# Altium footprint library DA, DD IC.PcbLib: 64 footprints (part 2 of 4)
Each footprint in its own frame and in the unit in brackets; x right, y up, seen from the top. Pads: shape width x height; smd on the part's side, far side on the other; paste and mask are expansions set on the pad; w line width, h text height; cw(c..) or ccw(c..) is an arc to the next point about the centre after c.
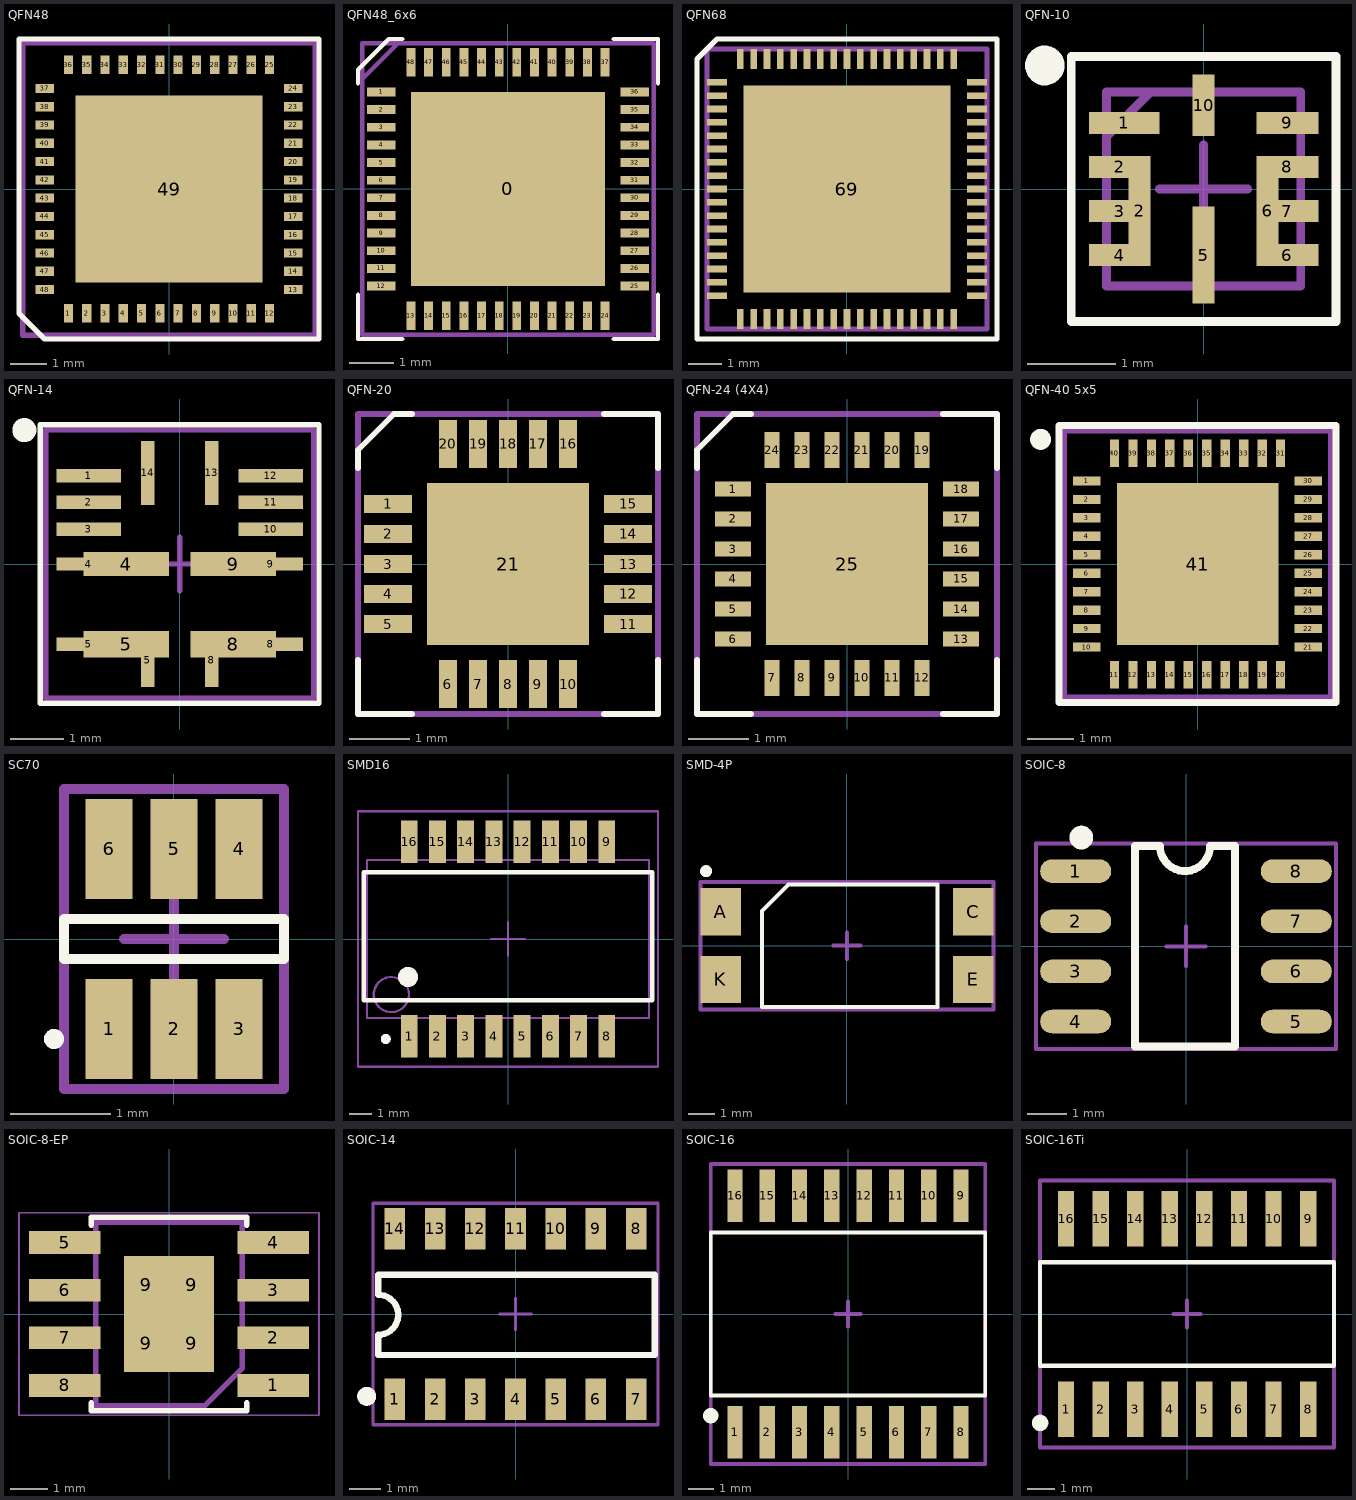
[diagram p1: the footprints below, top view; thin cyan lines are the x and y axes]

## QFN48 [mm] "6x6mm"
height 0.9
pads (49):
  rect 0.25x0.5 smd mask+0.07: 1(-2.75,-3.4) 2(-2.25,-3.4) 3(-1.75,-3.4) 4(-1.25,-3.4) 5(-0.75,-3.4) 6(-0.25,-3.4) 7(0.25,-3.4) 8(0.75,-3.4) 9(1.25,-3.4) 10(1.75,-3.4) 11(2.25,-3.4) 12(2.75,-3.4) 25(2.75,3.4) 26(2.25,3.4) 27(1.75,3.4) 28(1.25,3.4) 29(0.75,3.4) 30(0.25,3.4) 31(-0.25,3.4) 32(-0.75,3.4) 33(-1.25,3.4) 34(-1.75,3.4) 35(-2.25,3.4) 36(-2.75,3.4)
  rect 0.5x0.25 smd mask+0.07: 13(3.4,-2.75) 14(3.4,-2.25) 15(3.4,-1.75) 16(3.4,-1.25) 17(3.4,-0.75) 18(3.4,-0.25) 19(3.4,0.25) 20(3.4,0.75) 21(3.4,1.25) 22(3.4,1.75) 23(3.4,2.25) 24(3.4,2.75) 37(-3.4,2.75) 38(-3.4,2.25) 39(-3.4,1.75) 40(-3.4,1.25) 41(-3.4,0.75) 42(-3.4,0.25) 43(-3.4,-0.25) 44(-3.4,-0.75) 45(-3.4,-1.25) 46(-3.4,-1.75) 47(-3.4,-2.25) 48(-3.4,-2.75)
  rect 5.1x5.1 smd paste-2539.97 mask+0.07: 49(0,0)
Top Overlay:
  lines w0.15: -4.1,-3.4 -3.4,-4.1 4.1,-4.1 4.1,4.1 -4.1,4.1 -4.1,-3.4
Top Paste:
  rectangle: -0.5,-0.5 0.5,0.5
  rectangle: -0.5,1 0.5,2
  rectangle: -0.5,-2 0.5,-1
  rectangle: -2,-0.5 -1,0.5
  rectangle: -2,1 -1,2
  rectangle: -2,-2 -1,-1
  rectangle: 1,-0.5 2,0.5
  rectangle: 1,1 2,2
  rectangle: 1,-2 2,-1
Mechanical 15:
  lines w0.15: -0.5,0 0.5,0 ; 0,-0.5 0,0.5 ; -4,-4 -4,4 4,4 4,-4 -4,-4
3D body "ALSRobot-QFN48 7x7.step": height 0.78, standoff -0.02, extent -3.51,-3.51 3.51,3.51

## QFN48_6x6 [mm]
pads (49):
  rect 4.4x4.4 smd: 0(0,0)
  rect 0.65x0.2 smd: 1(-2.875,2.2) 2(-2.875,1.8) 3(-2.875,1.4) 4(-2.875,1) 5(-2.875,0.6) 6(-2.875,0.2) 7(-2.875,-0.2) 8(-2.875,-0.6) 9(-2.875,-1) 10(-2.875,-1.4) 11(-2.875,-1.8) 12(-2.875,-2.2) 25(2.875,-2.2) 26(2.875,-1.8) 27(2.875,-1.4) 28(2.875,-1) 29(2.875,-0.6) 30(2.875,-0.2) 31(2.875,0.2) 32(2.875,0.6) 33(2.875,1) 34(2.875,1.4) 35(2.875,1.8) 36(2.875,2.2)
  rect 0.2x0.65 smd: 13(-2.2,-2.875) 14(-1.8,-2.875) 15(-1.4,-2.875) 16(-1,-2.875) 17(-0.6,-2.875) 18(-0.2,-2.875) 19(0.2,-2.875) 20(0.6,-2.875) 21(1,-2.875) 22(1.4,-2.875) 23(1.8,-2.875) 24(2.2,-2.875) 37(2.2,2.875) 38(1.8,2.875) 39(1.4,2.875) 40(1,2.875) 41(0.6,2.875) 42(0.2,2.875) 43(-0.2,2.875) 44(-0.6,2.875) 45(-1,2.875) 46(-1.4,2.875) 47(-1.8,2.875) 48(-2.2,2.875)
Top Overlay:
  lines w0.1: -3.4,-2.4 -3.4,-3.4 -2.4,-3.4 ; -3.4,2.4 -3.4,2.7 -2.7,3.4 -2.4,3.4 ; 2.4,-3.4 3.4,-3.4 3.4,-2.4 ; 2.4,3.4 3.4,3.4 3.4,2.4
Mechanical 15:
  lines w0.1: -3.3,2.5 -2.5,3.3 ; -0.5,0 0.5,0 ; 0,-0.5 0,0.5 ; -3.3,-3.3 3.3,-3.3 3.3,3.3 -3.3,3.3 -3.3,-3.3
3D body "User Library-QFN48_0_4.step": height 0.91, standoff 0, extent -3,-3 3,3

## QFN68 [mm]
pads (69):
  rect 0.6x0.2 smd: 1(-3.9,3.2) 2(-3.9,2.8) 3(-3.9,2.4) 4(-3.9,2) 5(-3.9,1.6) 6(-3.9,1.2) 7(-3.9,0.8) 8(-3.9,0.4) 9(-3.9,0) 10(-3.9,-0.4) 11(-3.9,-0.8) 12(-3.9,-1.2) 13(-3.9,-1.6) 14(-3.9,-2) 15(-3.9,-2.4) 16(-3.9,-2.8) 17(-3.9,-3.2) 35(3.9,-3.2) 36(3.9,-2.8) 37(3.9,-2.4) 38(3.9,-2) 39(3.9,-1.6) 40(3.9,-1.2) 41(3.9,-0.8) 42(3.9,-0.4) 43(3.9,0) 44(3.9,0.4) 45(3.9,0.8) 46(3.9,1.2) 47(3.9,1.6) 48(3.9,2) 49(3.9,2.4) 50(3.9,2.8) 51(3.9,3.2)
  rect 0.2x0.6 smd: 18(-3.2,-3.9) 19(-2.8,-3.9) 20(-2.4,-3.9) 21(-2,-3.9) 22(-1.6,-3.9) 23(-1.2,-3.9) 24(-0.8,-3.9) 25(-0.4,-3.9) 26(0,-3.9) 27(0.4,-3.9) 28(0.8,-3.9) 29(1.2,-3.9) 30(1.6,-3.9) 31(2,-3.9) 32(2.4,-3.9) 33(2.8,-3.9) 34(3.2,-3.9) 52(3.2,3.9) 53(2.8,3.9) 54(2.4,3.9) 55(2,3.9) 56(1.6,3.9) 57(1.2,3.9) 58(0.8,3.9) 59(0.4,3.9) 60(0,3.9) 61(-0.4,3.9) 62(-0.8,3.9) 63(-1.2,3.9) 64(-1.6,3.9) 65(-2,3.9) 66(-2.4,3.9) 67(-2.8,3.9) 68(-3.2,3.9)
  rect 6.2x6.2 smd: 69(0,0)
Top Overlay:
  lines w0.15: -4.5,-4.5 -4.5,3.9 -3.9,4.5 4.5,4.5 4.5,-4.5 -4.5,-4.5
Mechanical 13:
  lines w0.15: -0.5,0 0.5,0 ; 0,-0.5 0,0.5 ; -4.2,-4.2 -4.2,4.2 4.2,4.2 4.2,-4.2 -4.2,-4.2
3D body "User Library-QFN68(8x8mm).step": height 0.85, standoff 0, extent -4.02,-4.02 4.02,4.02

## QFN-10 [mm] "2mmx2mmx1.6mm"
height 1.6
pads (12):
  rect 0.8x0.25 smd: 1(-0.9,0.75)
  rect 0.7x0.25 smd: 2(-0.95,0.25) 3(-0.95,-0.25) 4(-0.95,-0.75) 6(0.95,-0.75) 7(0.95,-0.25) 8(0.95,0.25) 9(0.95,0.75)
  rect 0.25x1.1 smd: 2(-0.725,-0.245) 5(0,-0.75) 6(0.725,-0.245)
  rect 0.25x0.7 smd: 10(0,0.95)
Top Overlay:
  circle w0.25: c-1.8,1.4 r0.1
  lines w0.1: -1.5,-1.5 1.5,-1.5 1.5,1.5 -1.5,1.5 -1.5,-1.5
Mechanical 15:
  lines w0.1: -1.1,0.6 -0.6,1.1 ; -0.5,0 0.5,0 ; 0,-0.5 0,0.5 ; -1.1,-1.1 1.1,-1.1 1.1,1.1 -1.1,1.1 -1.1,-1.1
3D body "User Library-QFN10.step": height 0.5, standoff 0, extent -1,-1 1,1

## QFN-14 [mm] "QFN-14 (4mmx4mmx1.6mm)"
height 1.6
pads (18):
  rect 1.2x0.25 smd: 1(-1.7,1.65) 2(-1.7,1.15) 3(-1.7,0.65) 4(-1.7,0) 5(-1.7,-1.5) 8(1.7,-1.5) 9(1.7,0) 10(1.7,0.65) 11(1.7,1.15) 12(1.7,1.65)
  rect 1.6x0.45 smd: 4(-1,0) 9(1,0)
  rect 1.6x0.5 smd: 5(-1,-1.5) 8(1,-1.5)
  rect 0.25x1 smd: 5(-0.6,-1.8) 8(0.6,-1.8)
  rect 0.25x1.2 smd: 13(0.6,1.7) 14(-0.6,1.7)
Top Overlay:
  circle w0.25: c-2.9,2.5 r0.1
  lines w0.1: -2.6,-2.6 2.6,-2.6 2.6,2.6 -2.6,2.6 -2.6,-2.6
Mechanical 15:
  lines w0.1: -0.5,0 0.5,0 ; 0,-0.5 0,0.5 ; -2.5,-2.5 2.5,-2.5 2.5,2.5 -2.5,2.5 -2.5,-2.5
3D body "QFN-14.STEP": height 1.61, standoff -0.02, extent -1.99,-2 2.01,2

## QFN-20 [mm]
pads (21):
  rect 0.8x0.3 smd mask+0.05: 1(-2,1) 2(-2,0.5) 3(-2,0) 4(-2,-0.5) 5(-2,-1) 11(2,-1) 12(2,-0.5) 13(2,0) 14(2,0.5) 15(2,1)
  rect 0.3x0.8 smd mask+0.05: 6(-1,-2) 7(-0.5,-2) 8(0,-2) 9(0.5,-2) 10(1,-2) 16(1,2) 17(0.5,2) 18(0,2) 19(-0.5,2) 20(-1,2)
  rect 2.7x2.7 smd mask+0.05: 21(0,0)
Top Overlay:
  lines w0.1: -2.5,-1.6 -2.5,-2.5 -1.6,-2.5 ; -2.5,1.6 -2.5,1.9 -1.9,2.5 -1.6,2.5 ; 1.6,-2.5 2.5,-2.5 2.5,-1.6 ; 1.6,2.5 2.5,2.5 2.5,1.6
Mechanical 15:
  lines w0.1: -0.5,0 0.5,0 ; 0,-0.5 0,0.5 ; -2.5,-2.5 -2.5,2.5 2.5,2.5 2.5,-2.5 -2.5,-2.5
3D body "User Library-QFN20_4x4x0_8.step": height 0.78, standoff -0.02, extent -2.01,-2.01 2.01,2.01

## QFN-24 (4X4) [mm]
pads (25):
  rect 0.6x0.25 smd mask+0.05: 1(-1.9,1.25) 2(-1.9,0.75) 3(-1.9,0.25) 4(-1.9,-0.25) 5(-1.9,-0.75) 6(-1.9,-1.25) 13(1.9,-1.25) 14(1.9,-0.75) 15(1.9,-0.25) 16(1.9,0.25) 17(1.9,0.75) 18(1.9,1.25)
  rect 0.25x0.6 smd mask+0.05: 7(-1.25,-1.9) 8(-0.75,-1.9) 9(-0.25,-1.9) 10(0.25,-1.9) 11(0.75,-1.9) 12(1.25,-1.9) 19(1.25,1.9) 20(0.75,1.9) 21(0.25,1.9) 22(-0.25,1.9) 23(-0.75,1.9) 24(-1.25,1.9)
  rect 2.7x2.7 smd mask+0.05: 25(0,0)
Top Overlay:
  lines w0.1: -2.5,-1.6 -2.5,-2.5 -1.6,-2.5 ; -2.5,1.6 -2.5,1.9 -1.9,2.5 -1.6,2.5 ; 1.6,-2.5 2.5,-2.5 2.5,-1.6 ; 1.6,2.5 2.5,2.5 2.5,1.6
Mechanical 15:
  lines w0.1: -0.5,0 0.5,0 ; 0,-0.5 0,0.5 ; -2.5,-2.5 2.5,-2.5 2.5,2.5 -2.5,2.5 -2.5,-2.5
3D body "User Library-QFN24.step": height 0.9, standoff 0, extent -2.005,-2.005 2.005,2.005

## QFN-40 5x5 [mm]
pads (41):
  rect 0.6x0.2 smd: 1(-2.4,1.8) 2(-2.4,1.4) 3(-2.4,1) 4(-2.4,0.6) 5(-2.4,0.2) 6(-2.4,-0.2) 7(-2.4,-0.6) 8(-2.4,-1) 9(-2.4,-1.4) 10(-2.4,-1.8) 21(2.4,-1.8) 22(2.4,-1.4) 23(2.4,-1) 24(2.4,-0.6) 25(2.4,-0.2) 26(2.4,0.2) 27(2.4,0.6) 28(2.4,1) 29(2.4,1.4) 30(2.4,1.8)
  rect 0.2x0.6 smd: 11(-1.8,-2.4) 12(-1.4,-2.4) 13(-1,-2.4) 14(-0.6,-2.4) 15(-0.2,-2.4) 16(0.2,-2.4) 17(0.6,-2.4) 18(1,-2.4) 19(1.4,-2.4) 20(1.8,-2.4) 31(1.8,2.4) 32(1.4,2.4) 33(1,2.4) 34(0.6,2.4) 35(0.2,2.4) 36(-0.2,2.4) 37(-0.6,2.4) 38(-1,2.4) 39(-1.4,2.4) 40(-1.8,2.4)
  rect 3.5x3.5 smd: 41(0,0)
Top Overlay:
  circle w0.25: c-3.4,2.7 r0.1
  lines w0.15: -3,-3 -3,3 3,3 3,-3 -3,-3
Mechanical 13:
  lines w0.15: -0.5,0 0.5,0 ; 0,-0.5 0,0.5 ; -2.9,-2.9 -2.9,2.9 2.9,2.9 2.9,-2.9 -2.9,-2.9
3D body "User Library-QFN40_500_500_090_360P040.step": height 0.9, standoff 0, extent -2.505,-2.505 2.505,2.505

## SC70 [mm]
pads (6):
  rect 0.47x1 smd mask+0.05: 1(-0.65,-0.9) 2(0,-0.9) 3(0.65,-0.9) 4(0.65,0.9) 5(0,0.9) 6(-0.65,0.9)
Top Overlay:
  circle w0.1: c-1.2,-1 r0.05
  lines w0.1: -1.1,-0.2 -1.1,0.2 1.1,0.2 1.1,-0.2 -1.1,-0.2
Mechanical 15:
  lines w0.1: -0.5,0 0.5,0 ; 0,-0.5 0,0.5 ; -1.1,-1.5 1.1,-1.5 1.1,1.5 -1.1,1.5 -1.1,-1.5
3D body "User Library-sot363.step": height 1, standoff 0, extent -1.05,-1.15 1.05,1.15

## SMD16 [mm] "TG110-E050N5"
pads (16):
  rect 0.76x1.91 smd: 1(-4.445,-4.38) 2(-3.175,-4.38) 3(-1.905,-4.38) 4(-0.635,-4.38) 5(0.635,-4.38) 6(1.905,-4.38) 7(3.175,-4.38) 8(4.445,-4.38) 9(4.445,4.38) 10(3.175,4.38) 11(1.905,4.38) 12(0.635,4.38) 13(-0.635,4.38) 14(-1.905,4.38) 15(-3.175,4.38) 16(-4.445,4.38)
Top Overlay:
  circle w0.5: c-4.5,-1.709 r0.2
  circle w0.25: c-5.5,-4.5 r0.1
  lines w0.2: -6.5,-2.75 6.5,-2.75 6.5,3 -6.5,3 -6.5,-2.75
Mechanical 13:
  circle w0.1: c-5.25,-2.5 r0.791
  lines w0.1: -6.35,-3.555 -6.35,3.555 6.35,3.555 6.35,-3.555 -6.35,-3.555
  text ".Designator" at 1.75,0.5 h2
Mechanical 15:
  lines w0.1: -0.75,0 0.75,0 ; 0,-0.75 0,0.75 ; -6.75,-5.75 6.75,-5.75 6.75,5.75 -6.75,5.75 -6.75,-5.75
3D body "User Library-Halo_SMD10base-T Module.STEP": height 5.04, standoff 0, extent -6.35,-4.754 6.35,4.763

## SMD-4P [mm]
height 4.1
pads (4):
  rect 1.52x1.78 smd: A(-4.75,1.27) C(4.75,1.27) E(4.75,-1.27) K(-4.75,-1.27)
Top Overlay:
  circle w0.25: c-5.3,2.8 r0.1
  lines w0.15: -3.2,-2.3 -3.2,1.3 -2.2,2.3 3.4,2.3 3.4,-2.3 -3.2,-2.3
Mechanical 13:
  lines w0.15: -0.5,0 0.5,0 ; 0,-0.5 0,0.5 ; -5.5,-2.4 5.5,-2.4 5.5,2.4 -5.5,2.4 -5.5,-2.4
3D body "User Library-PC817_Gullwing.STEP": height 3.85, standoff 0, extent -5,-2.29 5,2.29

## SOIC-8 [mm] "6x5x1.75 mm"
height 1.75
pads (8):
  oval 1.8x0.6 smd: 1(-2.794,1.905) 2(-2.794,0.635) 3(-2.794,-0.635) 4(-2.794,-1.905) 5(2.794,-1.905) 6(2.794,-0.635) 7(2.794,0.635) 8(2.794,1.905)
Top Overlay:
  circle w0.3: c-2.65,2.755 r0.15
  lines w0.2: -1.295,-2.54 1.245,-2.54 1.245,2.54 0.61,2.54 cw(c-0.025,2.54) -0.66,2.54 -1.295,2.54 -1.295,-2.54
Mechanical 15:
  lines w0.1: -0.5,0 0.5,0 ; 0,-0.5 0,0.5 ; -3.8,-2.6 -3.8,2.6 3.8,2.6 3.8,-2.6 -3.8,-2.6
3D body "User Library-so-8.step": height 1.88, standoff -0.03, extent -3.169,-2.5 3.169,2.504

## SOIC-8-EP [mm]
pads (12):
  rect 1.91x0.61 smd mask+0: 1(2.78,-1.905) 2(2.78,-0.635) 3(2.78,0.635) 4(2.78,1.905) 5(-2.78,1.905) 6(-2.78,0.635) 7(-2.78,-0.635) 8(-2.78,-1.905)
  rect 1.205x1.55 smd mask+0: 9(-0.603,-0.775) 9(-0.603,0.775) 9(0.603,-0.775) 9(0.603,0.775)
Top Overlay:
  lines w0.15: -2.075,-2.375 -2.075,-2.575 2.075,-2.575 2.075,-2.375 ; -2.075,2.375 -2.075,2.575 2.075,2.575 2.075,2.375
Mechanical 11:
  lines w0.15: -1.95,-2.45 -1.95,2.45 1.95,2.45 1.95,-1.45 0.95,-2.45 -1.95,-2.45
  text "'.Designator'" at 0.239,0.28 h1
Mechanical 13:
  lines w0.05: -4,-2.7 4,-2.7 4,2.7 -4,2.7 -4,-2.7

## SOIC-14 [mm]
pads (14):
  rect 0.65x1.31 smd mask+0.05: 1(-3.81,-2.7) 2(-2.54,-2.7) 3(-1.27,-2.7) 4(0,-2.7) 5(1.27,-2.7) 6(2.54,-2.7) 7(3.81,-2.7) 8(3.81,2.7) 9(2.54,2.7) 10(1.27,2.7) 11(0,2.7) 12(-1.27,2.7) 13(-2.54,2.7) 14(-3.81,2.7)
Top Overlay:
  circle w0.3: c-4.7,-2.6 r0.15
  lines w0.2: -4.34,-1.295 -4.34,-0.66 ccw(c-4.34,-0.025) -4.34,0.61 -4.34,1.245 4.4,1.245 4.4,-1.295 -4.34,-1.295
Mechanical 15:
  lines w0.1: -0.5,0 0.5,0 ; 0,-0.5 0,0.5 ; -4.5,-3.5 4.5,-3.5 4.5,3.5 -4.5,3.5 -4.5,-3.5
3D body "User Library-SOIC14-150.step": height 1.75, standoff 0, extent -4.275,-2.9 4.275,2.9

## SOIC-16 [mm]
pads (16):
  rect 0.6x2.05 smd: 1(-4.445,-4.65) 2(-3.175,-4.65) 3(-1.905,-4.65) 4(-0.635,-4.65) 5(0.635,-4.65) 6(1.905,-4.65) 7(3.175,-4.65) 8(4.445,-4.65) 9(4.445,4.65) 10(3.175,4.65) 11(1.905,4.65) 12(0.635,4.65) 13(-0.635,4.65) 14(-1.905,4.65) 15(-3.175,4.65) 16(-4.445,4.65)
Top Overlay:
  circle w0.3: c-5.4,-4 r0.15
  lines w0.15: -5.4,-3.2 5.4,-3.2 5.4,3.2 -5.4,3.2 -5.4,-3.2
Mechanical 15:
  lines w0.15: -0.5,0 0.5,0 ; 0,-0.5 0,0.5 ; -5.4,-5.9 5.4,-5.9 5.4,5.9 -5.4,5.9 -5.4,-5.9
3D body "User Library-so16w.step": height 3.5, standoff 0, extent -5.1,-5.15 5.1,5.15

## SOIC-16Ti [mm]
pads (16):
  rect 0.6x2.05 smd: 1(-4.445,-3.5) 2(-3.175,-3.5) 3(-1.905,-3.5) 4(-0.635,-3.5) 5(0.635,-3.5) 6(1.905,-3.5) 7(3.175,-3.5) 8(4.445,-3.5) 9(4.445,3.5) 10(3.175,3.5) 11(1.905,3.5) 12(0.635,3.5) 13(-0.635,3.5) 14(-1.905,3.5) 15(-3.175,3.5) 16(-4.445,3.5)
Top Overlay:
  circle w0.3: c-5.4,-4 r0.15
  lines w0.15: -5.4,-1.9 -5.4,1.9 5.4,1.9 5.4,-1.9 -5.4,-1.9
Mechanical 15:
  lines w0.15: -0.5,0 0.5,0 ; 0,-0.5 0,0.5 ; -5.4,-4.9 -5.4,4.9 5.4,4.9 5.4,-4.9 -5.4,-4.9
3D body "User Library-so16.step": height 1.7, standoff 0, extent -5.1,-3 5.1,3